# Altium footprint library Foot_Lib.PcbLib: 31 footprints (part 1 of 2)
Each footprint in its own frame and in the unit in brackets; x right, y up, seen from the top. Pads: shape width x height; smd on the part's side, far side on the other; paste and mask are expansions set on the pad; w line width, h text height; cw(c..) or ccw(c..) is an arc to the next point about the centre after c.
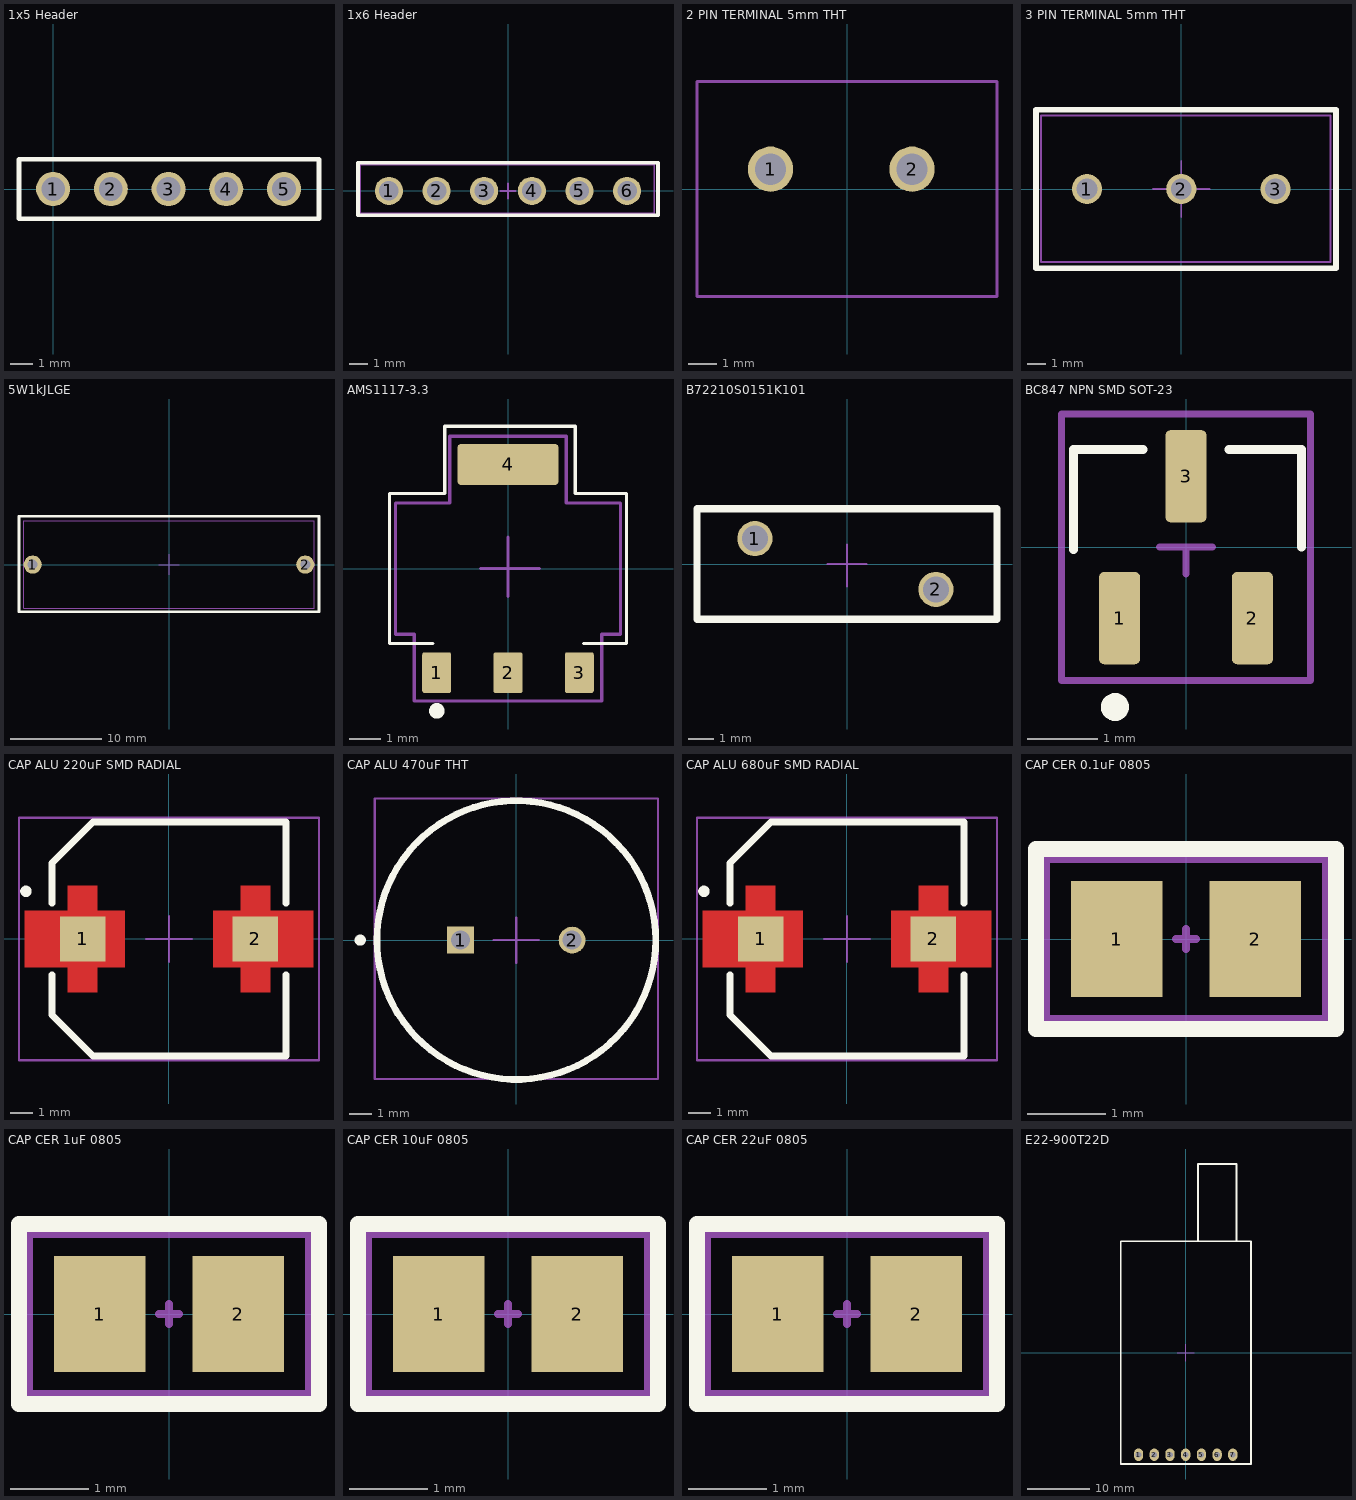
[diagram p0: the footprints below, top view; thin cyan lines are the x and y axes]

## 1x5 Header [mm]
pads (5):
  round 1.5 hole 1.04 mask+0.05: 1(0,0) 2(2.54,0) 3(5.08,0) 4(7.62,0) 5(10.16,0)
Top Overlay:
  lines w0.2: -1.5,-1.3 11.7,-1.3 11.7,1.3 -1.5,1.3 -1.5,-1.3
Top Component Center:
  lines w0.1: 4.38,0 5.08,0 ; 5.08,-0.7 5.08,0 ; 5.08,0.7 5.08,0 ; 5.78,0 5.08,0 ; -1.5,-1.3 -1.5,1.3 11.7,1.3 11.7,-1.3 -1.5,-1.3
Top Designator:
  text ".Designator" at 0.254,0.762 h1.52
3D body "User Library-DS1023-1x5S21.step": height 8.5, standoff -3, extent -1.5,-1.27 11.7,1.27

## 1x6 Header [mm]
pads (6):
  round 1.5 hole 1.04 mask+0.05: 1(-6.35,0) 2(-3.81,0) 3(-1.27,0) 4(1.27,0) 5(3.81,0) 6(6.35,0)
Top Overlay:
  lines w0.2: -8,-1.3 8,-1.3 8,1.5 -8,1.5 -8,-1.3
Top Component Center:
  lines w0.1: -0.4,0 0,0 ; 0,-0.4 0,0 ; 0,0.4 0,0 ; 0.4,0 0,0 ; -7.9,-1.2 7.8,-1.2 7.8,1.4 -7.9,1.4 -7.9,-1.2
Top Designator:
  text ".Designator" at -3.146,0.562 h1.52
3D body "User Library-Header_Fem_1X6.step": height 8.5, standoff -3.2, extent -7.92,-1.2 7.82,1.34

## 2 PIN TERMINAL 5mm THT [mm]
pads (2):
  round 1.6 hole 1.1 mask+0.05: 1(-2.7,0.7) 2(2.3,0.7)
Top Component Center:
  lines w0.1: -5.3,-3.8 5.3,-3.8 5.3,3.8 -5.3,3.8 -5.3,-3.8
3D body "DG306-5.0-02P-12-00AH.STEP": height 10, standoff -3.9, extent -5.3,-3.8 5.3,3.8

## 3 PIN TERMINAL 5mm THT [mm]
pads (3):
  round 1.6 hole 1.1 mask+0.05: 1(-5,0) 2(0,0) 3(5,0)
Top Overlay:
  lines w0.3: -7.7,-4.2 -7.7,4.2 8.2,4.2 8.2,-4.2 -7.7,-4.2
Top Component Center:
  lines w0.1: -1.5,0 0,0 ; 0,-1.5 0,0 ; 0,1.5 0,0 ; 1.5,0 0,0 ; -7.425,-3.875 -7.425,3.9 7.9,3.9 7.9,-3.875 -7.425,-3.875
Top Designator:
  text ".Designator" at -3.746,1.062 h1.52
3D body "dg-301-5_0.step": height 10.18, standoff -3.6, extent -7.44,-3.9 7.89,3.9

## 5W1kJLGE [mm]
pads (2):
  round 2 hole 1.1 mask+0.05: 1(-15,0) 2(15,0)
Top Overlay:
  lines w0.3: -16.51,-5.207 16.51,-5.207 16.51,5.334 -10.826,5.334 -16.51,5.334 -16.51,-5.207
Top Component Center:
  lines w0.1: -1.143,0 0,0 ; 0,-1.143 0,0 ; 0,1.143 0,0 ; 1.143,0 0,0 ; -16,-4.8 16,-4.8 16,4.8 -10.8,4.8 -16,4.8 -16,-4.8
Top Designator:
  text ".Designator" at -4.946,-0.438 h1.52
Top 3D Body:
  lines w0.1: -0.5,0 0.5,0 ; 0,-0.5 0,0.5
3D body: height 5, standoff -4, extent -15.397,-0.399 -14.6,0.399
3D body: height 5, standoff -4, extent 14.6,-0.399 15.397,0.399
3D body: height 5.2, standoff 4.4, extent -15.3,-0.398 -6.3,0.398
3D body: height 5.2, standoff 4.4, extent 6.3,-0.398 15.3,0.398
3D body: height 9.65, standoff 0, extent -11,-4.825 11,4.825

## AMS1117-3.3 [mm]
pads (4):
  rrect15% 0.93x1.31 smd: 1(-2.29,-3.345) 2(0,-3.345) 3(2.29,-3.345)
  rrect15% 3.24x1.31 smd: 4(0,3.345)
Top Overlay:
  circle w0.3: c-2.286,-4.572 r0.1
  lines w0.1: -2.413,-2.413 -3.81,-2.413 -3.81,2.413 -3.302,2.413 -2.413,2.413 -2.032,2.413 -2.032,4.572 2.159,4.572 2.159,2.413 2.442,2.413 3.81,2.413 3.81,-2.413 ; 2.435,-2.413 3.175,-2.413 3.803,-2.413
Top Component Center:
  lines w0.1: -0.889,0 0,0 ; 0,-0.889 0,0 ; 0,1.016 0,0 ; 1.016,0 0,0 ; -3.61,-2.11 -3.61,2.11 -1.87,2.11 -1.87,4.25 1.87,4.25 1.87,2.11 3.61,2.11 3.61,-2.11 3.01,-2.11 3.01,-4.25 -3.01,-4.25 -3.01,-2.11 -3.61,-2.11
Top Designator:
  text ".Designator" at -2.794,0 h1.52
3D body "AMS1117-3.3--3DModel-STEP-56544.STEP": height 1.77, standoff -0.04, extent -3.251,-3.372 3.251,3.626

## B72210S0151K101 [mm]
pads (2):
  round 1.4 hole 1.05: 1(-3.683,1.016) 2(3.556,-1.016)
Top Overlay:
  lines w0.3: -6,-2.2 6,-2.2 6,2.2 -6,2.2 -6,-2.2
Top Component Center:
  lines w0.1: -0.762,0 0,0 ; 0,-0.889 0,0 ; 0,0.762 0,0 ; 0.762,0 0,0 ; -5.969,-2.159 5.969,-2.159 5.969,2.159 -5.969,2.159 -5.969,-2.159
Top Designator:
  text ".Designator" at -2.54,0 h1.52
3D body "User Library-final MOV7,5.step": height 16.4, standoff -2.1, extent -5.816,-2.782 5.437,2.822

## BC847 NPN SMD SOT-23 [mm]
pads (3):
  rrect25% 0.59x1.32 smd: 1(-0.95,-1.015) 2(0.95,-1.015) 3(0,1.015)
Top Overlay:
  circle w0.2: c-1.016,-2.286 r0.1
  lines w0.127: -1.609,-0.035 -1.609,1.397 -0.615,1.397 ; 0.615,1.397 1.651,1.397 1.651,1.23 1.651,0.514 1.651,0
Top Component Center:
  lines w0.1: -0.381,0 0,0 ; 0,-0.381 0,0 ; 0.381,0 0,0 ; -1.778,-1.905 -1.778,1.905 1.778,1.905 1.778,-1.905 -1.778,-1.905
Top Designator:
  text ".Designator" at -1.397,-0.254 h1.52
3D body "step_temp.STEP": height 1.3, standoff 0, extent -1.45,-1.185 1.45,1.185

## CAP ALU 220uF SMD RADIAL [mm]
pads (2):
  rect 2x2 smd paste-2 mask+0: 1(-3.8,0) 2(3.8,0)
Top Layer:
  region: -3.15,1.25 -1.95,1.25 -1.95,-1.25 -3.15,-1.25 -3.15,-2.35 -4.45,-2.35 -4.45,-1.25 -6.35,-1.25 -6.35,1.25 -4.45,1.25 -4.45,2.35 -3.15,2.35
  region: 4.45,1.25 6.35,1.25 6.35,-1.25 4.45,-1.25 4.45,-2.35 3.15,-2.35 3.15,-1.25 1.95,-1.25 1.95,1.25 3.15,1.25 3.15,2.35 4.45,2.35
Top Overlay:
  circle w0.3: c-6.3,2.1 r0.1
  lines w0.3: -5.15,-1.57 -5.15,-3.35 -3.35,-5.15 5.15,-5.15 5.15,-1.57 ; -5.15,1.57 -5.15,3.35 -3.35,5.15 5.15,5.15 5.15,1.57
Top Paste:
  region: -3.15,1.25 -1.95,1.25 -1.95,-1.25 -3.15,-1.25 -3.15,-2.35 -4.45,-2.35 -4.45,-1.25 -6.35,-1.25 -6.35,1.25 -4.45,1.25 -4.45,2.35 -3.15,2.35
  region: 4.45,1.25 6.35,1.25 6.35,-1.25 4.45,-1.25 4.45,-2.35 3.15,-2.35 3.15,-1.25 1.95,-1.25 1.95,1.25 3.15,1.25 3.15,2.35 4.45,2.35
Top Solder:
  region: -3.05,1.35 -1.85,1.35 -1.85,-1.35 -3.05,-1.35 -3.05,-2.45 -4.55,-2.45 -4.55,-1.35 -6.45,-1.35 -6.45,1.35 -4.55,1.35 -4.55,2.45 -3.05,2.45
  region: 4.55,1.35 6.45,1.35 6.45,-1.35 4.55,-1.35 4.55,-2.45 3.05,-2.45 3.05,-1.35 1.85,-1.35 1.85,1.35 3.05,1.35 3.05,2.45 4.55,2.45
Top Component Center:
  lines w0.1: -1.016,0 0,0 ; 0,-1.016 0,0 ; 0,1.016 0,0 ; 1.016,0 0,0 ; -6.604,-5.334 -6.604,-0.635 -6.604,5.334 6.604,5.334 6.604,-5.334 -6.604,-5.334
Top Designator:
  text ".Designator" at -2.032,1.905 h1.52
3D body "step_temp.STEP": height 10.5, standoff 0, extent -5.85,-5.15 5.85,5.15

## CAP ALU 470uF THT [mm]
pads (2):
  rect 1.2x1.2 hole 0.85: 1(-2.5,0)
  round 1.2 hole 0.85: 2(2.5,0)
Top Overlay:
  circle w0.3: c0,0 r6.25
  circle w0.3: c-7,0 r0.1
Top Component Center:
  lines w0.1: -1.016,0 0,0 ; 0,-1.016 0,0 ; 0,1.016 0,0 ; 1.016,0 0,0 ; -6.35,-6.223 -6.35,6.35 6.35,6.35 6.35,-6.223 -6.35,-6.223
Top Designator:
  text ".Designator" at -4.318,1.016 h1.52
3D body "step_temp.STEP": height 12.5, standoff -17, extent -6.25,-6.249 6.25,6.249

## CAP ALU 680uF SMD RADIAL [mm]
pads (2):
  rect 2x2 smd paste-2 mask+0: 1(-3.8,0) 2(3.8,0)
Top Layer:
  region: 4.45,1.25 6.35,1.25 6.35,-1.25 4.45,-1.25 4.45,-2.35 3.15,-2.35 3.15,-1.25 1.95,-1.25 1.95,1.25 3.15,1.25 3.15,2.35 4.45,2.35
  region: -3.15,1.25 -1.95,1.25 -1.95,-1.25 -3.15,-1.25 -3.15,-2.35 -4.45,-2.35 -4.45,-1.25 -6.35,-1.25 -6.35,1.25 -4.45,1.25 -4.45,2.35 -3.15,2.35
Top Overlay:
  circle w0.3: c-6.3,2.1 r0.1
  lines w0.3: -5.15,-1.57 -5.15,-3.35 -3.35,-5.15 5.15,-5.15 5.15,-1.57 ; -5.15,1.57 -5.15,3.35 -3.35,5.15 5.15,5.15 5.15,1.57
Top Paste:
  region: 4.45,1.25 6.35,1.25 6.35,-1.25 4.45,-1.25 4.45,-2.35 3.15,-2.35 3.15,-1.25 1.95,-1.25 1.95,1.25 3.15,1.25 3.15,2.35 4.45,2.35
  region: -3.15,1.25 -1.95,1.25 -1.95,-1.25 -3.15,-1.25 -3.15,-2.35 -4.45,-2.35 -4.45,-1.25 -6.35,-1.25 -6.35,1.25 -4.45,1.25 -4.45,2.35 -3.15,2.35
Top Solder:
  region: 4.55,1.35 6.45,1.35 6.45,-1.35 4.55,-1.35 4.55,-2.45 3.05,-2.45 3.05,-1.35 1.85,-1.35 1.85,1.35 3.05,1.35 3.05,2.45 4.55,2.45
  region: -3.05,1.35 -1.85,1.35 -1.85,-1.35 -3.05,-1.35 -3.05,-2.45 -4.55,-2.45 -4.55,-1.35 -6.45,-1.35 -6.45,1.35 -4.55,1.35 -4.55,2.45 -3.05,2.45
Top Component Center:
  lines w0.1: -1.016,0 0,0 ; 0,-1.016 0,0 ; 0,1.016 0,0 ; 1.016,0 0,0 ; -6.604,-5.334 6.604,-5.334 6.604,5.334 -6.604,5.334 -6.604,-0.635 -6.604,-5.334
Top Designator:
  text ".Designator" at -2.032,1.905 h1.52
3D body "step_temp.STEP": height 10.5, standoff 0, extent -5.85,-5.15 5.85,5.15

## CAP CER 0.1uF 0805 [mm]
pads (2):
  rect 1.16x1.47 smd: 1(-0.88,0) 2(0.88,0)
Top Overlay:
  lines w0.2: -1.905,-1.143 1.905,-1.143 1.905,1.143 -1.905,1.143 -1.905,-1.143
Top Component Center:
  lines w0.1: -0.127,0 0,0 ; 0,-0.127 0,0 ; 0,0.127 0,0 ; 0.127,0 0,0 ; -1.778,-1.016 -1.778,1.016 1.778,1.016 1.778,-1.016 -1.778,-1.016
Top Designator:
  text ".Designator" at -1.524,1.143 h1.52
3D body "Ceramic_Capacitor_0805_h50mil_Solder.step": height 1.27, standoff 0, extent -1.6,-0.825 1.6,0.825

## CAP CER 1uF 0805 [mm]
pads (2):
  rect 1.16x1.47 smd: 1(-0.88,0) 2(0.88,0)
Top Overlay:
  lines w0.2: -1.905,-1.143 -1.905,1.143 1.905,1.143 1.905,-1.143 -1.905,-1.143
Top Component Center:
  lines w0.1: -0.127,0 0,0 ; 0,-0.127 0,0 ; 0,0.127 0,0 ; 0.127,0 0,0 ; -1.778,-1.016 1.778,-1.016 1.778,1.016 -1.778,1.016 -1.778,-1.016
Top Designator:
  text ".Designator" at -1.524,1.143 h1.52
3D body "Ceramic_Capacitor_0805_h50mil_Solder.step": height 1.27, standoff 0, extent -1.6,-0.825 1.6,0.825

## CAP CER 10uF 0805 [mm]
pads (2):
  rect 1.16x1.47 smd: 1(-0.88,0) 2(0.88,0)
Top Overlay:
  lines w0.2: -1.905,-1.143 1.905,-1.143 1.905,1.143 -1.905,1.143 -1.905,-1.143
Top Component Center:
  lines w0.1: -0.127,0 0,0 ; 0,-0.127 0,0 ; 0,0.127 0,0 ; 0.127,0 0,0 ; -1.778,-1.016 -1.778,1.016 1.778,1.016 1.778,-1.016 -1.778,-1.016
Top Designator:
  text ".Designator" at -1.524,1.143 h1.52
3D body "Ceramic_Capacitor_0805_h50mil_Solder.step": height 1.27, standoff 0, extent -1.6,-0.825 1.6,0.825

## CAP CER 22uF 0805 [mm]
pads (2):
  rect 1.16x1.47 smd: 1(-0.88,0) 2(0.88,0)
Top Overlay:
  lines w0.2: -1.905,-1.143 1.905,-1.143 1.905,1.143 -1.905,1.143 -1.905,-1.143
Top Component Center:
  lines w0.1: -0.127,0 0,0 ; 0,-0.127 0,0 ; 0,0.127 0,0 ; 0.127,0 0,0 ; -1.778,-1.016 -1.778,1.016 1.778,1.016 1.778,-1.016 -1.778,-1.016
Top Designator:
  text ".Designator" at -1.524,1.143 h1.52
3D body "Ceramic_Capacitor_0805_h50mil_Solder.step": height 1.27, standoff 0, extent -1.6,-0.825 1.6,0.825

## E22-900T22D [mm]
pads (7):
  oval 1.5x2 hole 0.92 mask+0.05: 1(-7.62,-16.5) 2(-5.08,-16.5) 3(-2.54,-16.5) 4(0,-16.5) 5(2.54,-16.5) 6(5.08,-16.5) 7(7.62,-16.5)
Top Overlay:
  lines w0.3: 2,18 2,30.5 8.2,30.5 8.2,18 ; -10.5,-18 10.58,-18 10.58,18 -10.5,18 -10.5,-18
Top Component Center:
  lines w0.1: -1.4,0 0,0 ; 0,-1.4 0,0 ; 0,1.4 0,0 ; 1.4,0 0,0 ; -10.5,-18 10.6,-18 10.6,18 -10.5,18 -10.5,-18
Top Designator:
  text ".Designator" at -5.246,0.562 h1.52
3D body "E32-433T20DTyitteerstnoluyyp.STEP": height 7.9, standoff -5.72, extent -10.47,-18.02 10.53,30.48